# Altium footprint library SuperCap.PcbLib: 35 footprints (part 3 of 3)
Each footprint in its own frame and in the unit in brackets; x right, y up, seen from the top. Pads: shape width x height; smd on the part's side, far side on the other; paste and mask are expansions set on the pad; w line width, h text height; cw(c..) or ccw(c..) is an arc to the next point about the centre after c.
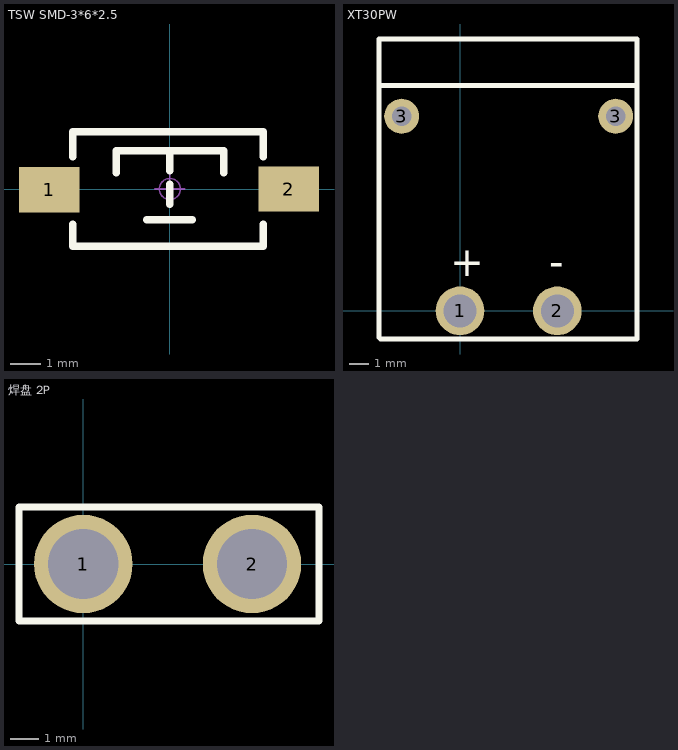
[diagram p2: the footprints below, top view; thin cyan lines are the x and y axes]

## TSW SMD-3*6*2.5 [mm] "3*6*2.5mm"
pads (2):
  rect 2x1.5 smd: 1(-3.996,-0.02) 2(3.937,0)
Top Overlay:
  lines w0.254: -3.212,-1.168 -3.212,-1.9 3.088,-1.9 3.088,-1.168 ; -3.212,1.067 -3.212,1.9 3.088,1.9 3.088,1.067 ; -1.778,0.533 -1.778,1.27 1.778,1.27 1.778,0.533 ; -0.762,-1.016 0.737,-1.016 ; 0,-0.508 0,0.152 ; 0,0.61 0,1.27
Mechanical 15:
  circle w0.05: c0,0 r0.35
  lines w0.05: -0.5,0 0.5,0 ; 0,-0.5 0,0.5
3D body "TSW SMD-3x6x2.5.STEP": height 2.59, standoff -0.03, extent -4,-1.877 4,1.623

## XT30PW [mm]
pads (4):
  round 2.5 hole 1.7: 1(0,0) 2(5,0)
  round 1.8 hole 1: 3(-3,10) 3(8,10)
Top Overlay:
  lines w0.254: -4.166,-1.372 -4.166,11.582 ; -4.089,-1.448 9.093,-1.448 9.093,11.557 9.093,13.97 -4.166,13.97 -4.166,11.582 ; 9.068,11.582 -4.166,11.582
  text "-" at 4.572,1.778 h1.52
  text "+" at -0.508,1.778 h1.52
3D body "User Library-XT30- curved.STEP": height 5.5, standoff -1.6, extent -4.161,-1.016 9.139,13.99

## 焊盘 2P [mm]
pads (2):
  round 3.5 hole 2.5: 1(0,0) 2(6,0)
Top Overlay:
  lines w0.254: -2.286,-2.032 -2.286,0 -2.286,2.032 8.382,2.032 8.382,0 8.382,-2.032 -2.286,-2.032